# Altium schematic symbol library LATTICEPLDS_Library.SchLib: 291 symbols (part 13 of 32)
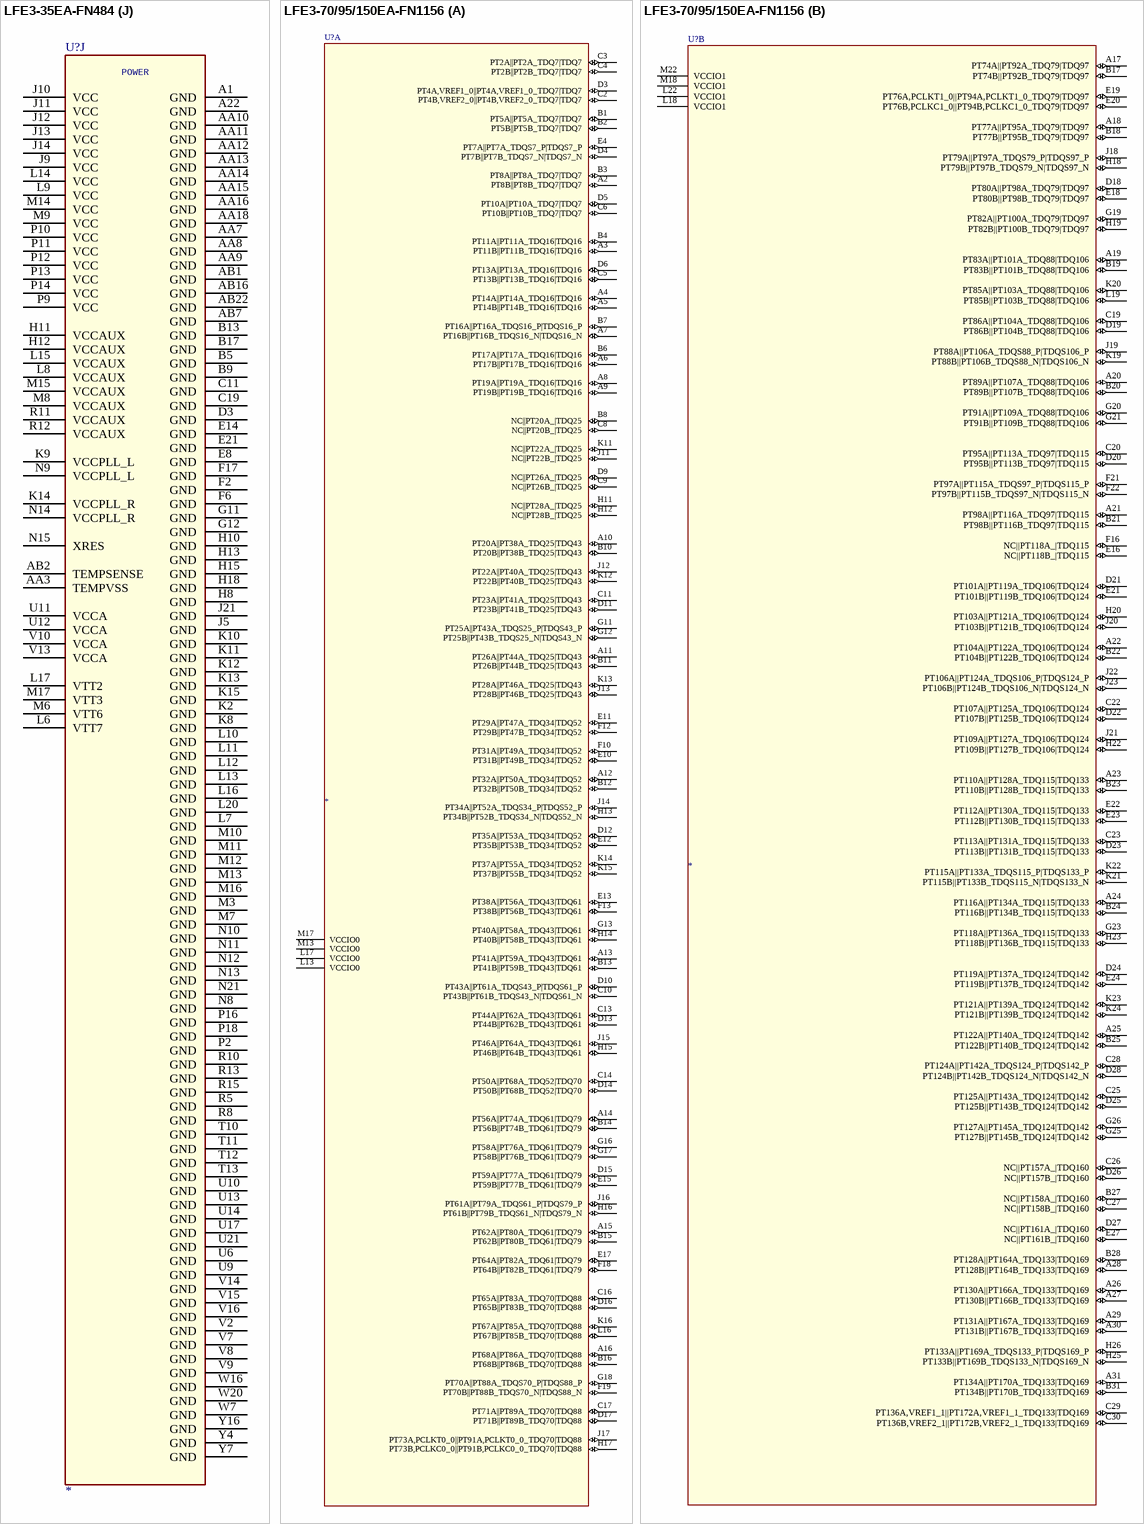
[diagram p315: symbols LFE3-35EA-FN484 to LFE3-70/95/150EA-FN1156]

## LFE3-35EA-FN484
designator U?
SPLIT_INST: TRUE; SWAP_INFO: (S1+S2+S3+S4+S5+S6+S7+S8+S9+S10)
part A pins: A2 PT8B (TDQ7), A3 PT11A (TDQ16), A4 PT11B (TDQ16), A5 PT14A (TDQ16), A6 PT14B (TDQ16), A7 PT26B (TDQ25), A8 PT29B (TDQ34), A9 PT32A (TDQ34), A10 PT35A (TDQ34), A11 PT35B (TDQ34), B3 PT8A (TDQ7), B4 PT2B (TDQ7), B6 PT5B (TDQ7), B7 PT26A (TDQ25), B8 PT29A (TDQ34), B10 PT32B (TDQ34), C5 PT2A (TDQ7), C6 PT5A (TDQ7), C7 PT20B (TDQ25), C8 PT20A (TDQ25), C9 PT23A (TDQ25), C10 PT23B (TDQ25), D5 PT4B ||  VREF2_0 (TDQ7), D6 PT10A (TDQ7), D7 PT10B (TDQ7), D8 PT28A (TDQ25), D9 PT25A (TDQS25), D10 PT25B (TDQ25), D11 PT34B (TDQ34), E6 PT4A ||  VREF1_0 (TDQ7), E7 PT28B (TDQ25), E9 PT22B (TDQ25), E10 PT31B (TDQ34), E11 PT34A (TDQS34), F7 PT13A (TDQ16), F8 PT7A (TDQS7), F9 PT22A (TDQ25), F10 PT31A (TDQ34), F11 PT37A ||  PCLKT0_0 (TDQ34), F12 PT37B ||  PCLKC0_0 (TDQ34), G8 PT13B (TDQ16), G9 PT7B (TDQ7), G10 VCCIO0 (power), H9 VCCIO0 (power)
part B pins: A12 PT41A (TDQ43), A13 PT41B (TDQ43), A14 PT47A (TDQ52), A15 PT50A (TDQ52), A16 PT56A (TDQ61), A17 PT59A (TDQ61), A18 PT62A (TDQ61), A19 PT62B (TDQ61), B11 PT38A (TDQ43), B12 PT38B (TDQ43), B14 PT47B (TDQ52), B15 PT50B (TDQ52), B16 PT56B (TDQ61), B18 PT59B (TDQ61), C12 PT40A ||  PCLKT1_0 (TDQ43), C13 PT44A (TDQ43), C14 PT44B (TDQ43), C15 PT53A (TDQ52), C16 PT61B (TDQ61), C17 PT61A (TDQS61), D12 PT40B ||  PCLKC1_0 (TDQ43), D13 PT46A (TDQ43), D14 PT46B (TDQ43), D15 PT53B (TDQ52), D16 PT64A ||  VREF1_1 (TDQ61), D17 PT64B ||  VREF2_1 (TDQ61), E12 PT43A (TDQS43), E13 PT43B (TDQ43), E15 PT52B (TDQ52), E16 PT52A (TDQS52), F13 PT49A (TDQ52), F14 PT49B (TDQ52), F15 PT58A (TDQ61), F16 PT58B (TDQ61), G13 VCCIO1 (power), G14 PT55B (TDQ52), G15 PT55A (TDQ52), H14 VCCIO1 (power)
part C pins: E22 PR18A (RDQ23), F22 PR18B (RDQ23), G21 PR21A* (RDQ23), G22 PR21B* (RDQ23), H21 PR24A (RDQ23), H22 PR24B (RDQ23), J15 VCCIO2 (power), J17 PR20A* (RDQ23), J18 PR20B* (RDQ23), J19 PR23A (RDQS23), J20 PR23B (RDQ23), J22 PR27A (RDQ32), K16 VCCIO2 (power), K17 PR26A* ||  VREF1_2 (RDQ23), K18 PR26B* ||  VREF2_2 (RDQ23), K19 PR29B* ||  RUM0_GDLLT_IN_B (RDQ32), K20 PR29A* ||  RUM0_GDLLT_IN_A (RDQ32), K21 PR30A* ||  RUM0_GDLLT_FB_A (RDQ32), K22 PR27B (RDQ32), L18 PR32A (RDQS32), L19 PR32B (RDQ32), L21 PR30B* ||  RUM0_GDLLT_FB_B (RDQ32), L22 PR33A (RDQ32), M18 PR35E_C ||  RUM0_GPLLT_IN_A (RDQ32), M20 PR35B* ||  PCLKC2_0 (RDQ32), M21 PR35A* ||  PCLKT2_0 (RDQ32), M22 PR33B (RDQ32), N17 PR35E_D ||  RUM0_GPLLT_IN_B (RDQ32), N22 PR35E_B ||  RUM0_GPLLT_FB_B (RDQ32), P21 PR35E_A ||  RUM0_GPLLT_FB_A (RDQ32)
part D pins: AA17 PB62B, AA19 PB71A, AA20 PR71A* (RDQ68), AA21 PR68A (RDQS68), AA22 PR63A (RDQ68), AB17 PB62A, AB18 PB65A, AB19 PB65B, AB20 PR71B* (RDQ68), AB21 PR63B (RDQ68), M19 PR38B* ||  PCLKC3_0 (RDQ41), N16 VCCIO3 (power), N18 PR41A (RDQS41), N19 PR38A* ||  PCLKT3_0 (RDQ41), N20 PR44B* ||  VREF2_3 (RDQ41), P15 VCCIO3 (power), P17 PR47B* (RDQ50), P19 PR41B (RDQ41), P20 PR44A* ||  VREF1_3 (RDQ41), P22 PR36A (RDQ41), R14 PB64B, R16 PR47A* (RDQ50), R17 PR53E_C ||  RLM1_GPLLT_IN_A (RDQ50), R18 PR53B* (RDQ50), R19 PR53A* (RDQ50), R20 PR42B (RDQ41), R21 PR36B (RDQ41), R22 PR39A* (RDQ41), T14 PB64A, T15 PB73A, T16 PB73B, T17 PR53E_D ||  RLM1_GPLLT_IN_B (RDQ50), T18 PR65B* (RDQ68), T19 PR65A* (RDQ68), T20 PR42A (RDQ41), T21 PR50A (RDQS50), T22 PR39B* (RDQ41), U15 PB61B, U16 PB61A, U18 PR66B* (RDQ68), U19 PR66A* (RDQ68), U20 PR50B (RDQ50), U22 PR45A (RDQ50), V17 PB70B, V18 PB70A, V19 PR69B (RDQ68), V20 PR53E_B ||  RLM1_GPLLT_FB_B (RDQ50), V21 PR53E_A ||  RLM1_GPLLT_FB_A (RDQ50), V22 PR45B (RDQ50), W17 PB67B, W18 PB67A, W19 PR69A (RDQ68), W21 PR51B (RDQ50), W22 PR48B* (RDQ50), Y17 PB68A, Y18 PB68B, Y19 PB71B, Y20 PR68B (RDQ68), Y21 PR51A (RDQ50), Y22 PR48A* (RDQ50)
part E pins: AA1 PL66A* (LDQ68), AA2 PL69B (LDQ68), AA4 PB5A, AA5 PB5B, AA6 PB11B, AB3 PB2A, AB4 PB2B, AB5 PB8A, AB6 PB8B, L2 PL36B (LDQ41), L3 PL36A (LDQ41), L4 PL38A* ||  PCLKT6_0 (LDQ41), M1 PL39B* (LDQ41), M2 PL39A* (LDQ41), M4 PL38B* ||  PCLKC6_0 (LDQ41), M5 PL41A (LDQS41), N1 PL42B (LDQ41), N2 PL42A (LDQ41), N3 PL45A (LDQ50), N4 PL44A* ||  VREF1_6 (LDQ41), N5 PL47A* (LDQ50), N6 PL41B (LDQ41), N7 VCCIO6 (power), P1 PL48A* (LDQ50), P3 PL45B (LDQ50), P4 PL44B* ||  VREF2_6 (LDQ41), P5 PL50A (LDQS50), P6 PL47B* (LDQ50), P7 PL56B* (LDQ59), P8 VCCIO6 (power), R1 PL48B* (LDQ50), R2 PL51B (LDQ50), R3 PL51A (LDQ50), R4 PL62A* (LDQ59), R6 PL50B (LDQ50), R7 PL59A (LDQS59), R9 PB16A, T1 PL53E_B ||  LLM1_GPLLT_FB_B (LDQ50), T2 PL53E_A ||  LLM1_GPLLT_FB_A (LDQ50), T3 PL53E_C ||  LLM1_GPLLT_IN_A (LDQ50), T4 PL65A* (LDQ68), T5 PL62B* (LDQ59), T6 PL68A (LDQS68), T7 PL59B (LDQ59), T8 PB13B, T9 PB16B, U1 PL53A* (LDQ50), U2 PL53B* (LDQ50), U3 PL53E_D ||  LLM1_GPLLT_IN_B (LDQ50), U4 PL65B* (LDQ68), U5 PL68B (LDQ68), U7 PB10B, U8 PB13A, V1 PL57A* (LDQ59), V3 PL60A (LDQ59), V4 PL71A* (LDQ68), V5 PL71B* (LDQ68), V6 PB10A, W1 PL57B* (LDQ59), W2 PL63A (LDQ68), W3 PL60B (LDQ59), W4 PB4A, W5 PB7A, W6 PB7B, Y1 PL63B (LDQ68), Y2 PL66B* (LDQ68), Y3 PL69A (LDQ68), Y5 PB4B, Y6 PB11A
part F pins: B1 PL21A* (LDQ23), B2 PL12A* (LDQ14), C1 PL21B* (LDQ23), C2 PL12B* (LDQ14), D1 PL15B (LDQ14), D2 PL15A (LDQ14), D4 PL9B (LDQ14), E1 PL26A* ||  VREF1_7 (LDQ23), E2 PL18A (LDQ23), E3 PL9A (LDQ14), E4 PL11B* (LDQ14), E5 PL11A* (LDQ14), F1 PL26B* ||  VREF2_7 (LDQ23), F3 PL18B (LDQ23), F4 PL14B (LDQ14), F5 PL14A (LDQS14), G1 PL27A (LDQ32), G2 PL24B (LDQ23), G3 PL24A (LDQ23), G4 PL17A* (LDQ14), G5 PL17B* (LDQ14), H1 PL27B (LDQ32), H2 PL30A* ||  LUM0_GDLLT_FB_A (LDQ32), H3 PL30B* ||  LUM0_GDLLT_FB_B (LDQ32), H4 PL20A* (LDQ23), H5 PL23A (LDQS23), H6 PL23B (LDQ23), J1 PL33B (LDQ32), J2 PL33A (LDQ32), J3 PL32A (LDQS32), J4 PL20B* (LDQ23), J6 PL29B* ||  LUM0_GDLLT_IN_B (LDQ32), J7 PL29A* ||  LUM0_GDLLT_IN_A (LDQ32), J8 VCCIO7 (power), K1 PL35E_A ||  LUM0_GPLLT_FB_A (LDQ32), K3 PL32B (LDQ32), K4 PL35A* ||  PCLKT7_0 (LDQ32), K5 PL35B* ||  PCLKC7_0 (LDQ32), K6 PL35E_D ||  LUM0_GPLLT_IN_B (LDQ32), K7 VCCIO7 (power), L1 PL35E_B ||  LUM0_GPLLT_FB_B (LDQ32), L5 PL35E_C ||  LUM0_GPLLT_IN_A (LDQ32)
part G pins: A20 PT71A , A21 PR9A ||  DOUT/CSON/CSSPI1N, B19 PT68B , B20 PT71B , B21 CFG2, B22 PR9B ||  MCLK, C18 PT68A, C20 PROGRAMN, C21 PR6A ||  HFP, C22 PR12A ||  D1, D18 PT73A , D19 PT73B , D20 INITN, D21 PR6B ||  DI/CSSPI0N/CEN/CSSPIN, D22 PR12B ||  D2, E17 PT70B , E18 PT70A, E19 CFG1, E20 CFG0, F18 PR8B ||  CSN/SN/CONT1N/OEN, F19 PR8A ||  CS1N/HOLDN/CONT2N/RDY, F20 CCLK, F21 DONE, G16 VCCIO8 (power), G17 PR14A ||  D3/SI, G18 PR14B ||  D4/SO, G19 PR15A ||  D5, G20 PR15B ||  D6/SPID1, H16 VCCIO8 (power), H17 PR11B ||  D0/SPIFASTN, H19 PR17A ||  D7/SPID0, H20 PR17B ||  BUSY/SISPI/AVDN, J16 PR11A ||  WRITEN
part H pins: C3 TDO (out), C4 TMS (in), G6 TDI (in), G7 TCK (in), H7 VCCJ (power)
part I pins: AB8 PCSA_HDOUTP3, AB9 PCSA_HDOUTN3, AB10 PCSA_HDOUTN2, AB11 PCSA_HDOUTP2, AB12 PCSA_HDOUTP1, AB13 PCSA_HDOUTN1, AB14 PCSA_HDOUTN0, AB15 PCSA_HDOUTP0, V11 PCSA_REFCLKN, V12 PCSA_REFCLKP, W8 PCSA_VCCIB3, W9 PCSA_VCCOB3, W10 PCSA_VCCOB2, W11 PCSA_VCCIB2, W12 PCSA_VCCIB1, W13 PCSA_VCCOB1, W14 PCSA_VCCOB0, W15 PCSA_VCCIB0, Y8 PCSA_HDINP3, Y9 PCSA_HDINN3, Y10 PCSA_HDINN2, Y11 PCSA_HDINP2, Y12 PCSA_HDINP1, Y13 PCSA_HDINN1, Y14 PCSA_HDINN0, Y15 PCSA_HDINP0
part J pins: A1 GND (power), A22 GND (power), AA3 TEMPVSS, AA7 GND (power), AA8 GND (power), AA9 GND (power), AA10 GND (power), AA11 GND (power), AA12 GND (power), AA13 GND (power), AA14 GND (power), AA15 GND (power), AA16 GND (power), AA18 GND (power), AB1 GND (power), AB2 TEMPSENSE, AB7 GND (power), AB16 GND (power), AB22 GND (power), B5 GND (power), B9 GND (power), B13 GND (power), B17 GND (power), C11 GND (power), C19 GND (power), D3 GND (power), E8 GND (power), E14 GND (power), E21 GND (power), F2 GND (power), F6 GND (power), F17 GND (power), G11 GND (power), G12 GND (power), H8 GND (power), H10 GND (power), H11 VCCAUX (power), H12 VCCAUX (power), H13 GND (power), H15 GND (power), H18 GND (power), J5 GND (power), J9 VCC (power), J10 VCC (power), J11 VCC (power), J12 VCC (power), J13 VCC (power), J14 VCC (power), J21 GND (power), K2 GND (power), K8 GND (power), K9 VCCPLL_L (power), K10 GND (power), K11 GND (power), K12 GND (power), K13 GND (power), K14 VCCPLL_R (power), K15 GND (power), L6 VTT7 (power), L7 GND (power), L8 VCCAUX (power), L9 VCC (power), L10 GND (power), L11 GND (power), L12 GND (power), L13 GND (power), L14 VCC (power), L15 VCCAUX (power), L16 GND (power), L17 VTT2 (power), L20 GND (power), M3 GND (power), M6 VTT6 (power), M7 GND (power), M8 VCCAUX (power), M9 VCC (power), M10 GND (power), M11 GND (power), M12 GND (power), M13 GND (power), M14 VCC (power), M15 VCCAUX (power), M16 GND (power), M17 VTT3 (power), N8 GND (power), N9 VCCPLL_L (power), N10 GND (power), N11 GND (power), N12 GND (power), N13 GND (power), N14 VCCPLL_R (power), N15 XRES, N21 GND (power), P2 GND (power), P9 VCC (power), P10 VCC (power), P11 VCC (power), P12 VCC (power), P13 VCC (power), P14 VCC (power), P16 GND (power), P18 GND (power), R5 GND (power), R8 GND (power), R10 GND (power), R11 VCCAUX (power), R12 VCCAUX (power), R13 GND (power), R15 GND (power), T10 GND (power), T11 GND (power), T12 GND (power), T13 GND (power), U6 GND (power), U9 GND (power), U10 GND (power), U11 VCCA (power), U12 VCCA (power), U13 GND (power), U14 GND (power), U17 GND (power), U21 GND (power), V2 GND (power), V7 GND (power), V8 GND (power), V9 GND (power), V10 VCCA (power), V13 VCCA (power), V14 GND (power), V15 GND (power), V16 GND (power), W7 GND (power), W16 GND (power), W20 GND (power), Y4 GND (power), Y7 GND (power), Y16 GND (power)
part A text: BANK0; 1st_Fn. || 2nd_Fn. (DQ)
part B text: BANK1; 1st_Fn. || 2nd_Fn. (DQ)
part C text: BANK2; * = TRUE LVDS Output; 1st_Fn. || 2nd_Fn. (DQ)
part D text: BANK3; * = TRUE LVDS Output; 1st_Fn. || 2nd_Fn. (DQ)
part E text: BANK6; * = TRUE LVDS Output; 1st_Fn. || 2nd_Fn. (DQ)
part F text: BANK7; * = TRUE LVDS Output; 1st_Fn. || 2nd_Fn. (DQ)
part G text: BANK8; 1st_Fn. || 2nd_Fn.
part H text: JTAG
part I text: SERDES/PCS
part J text: POWER

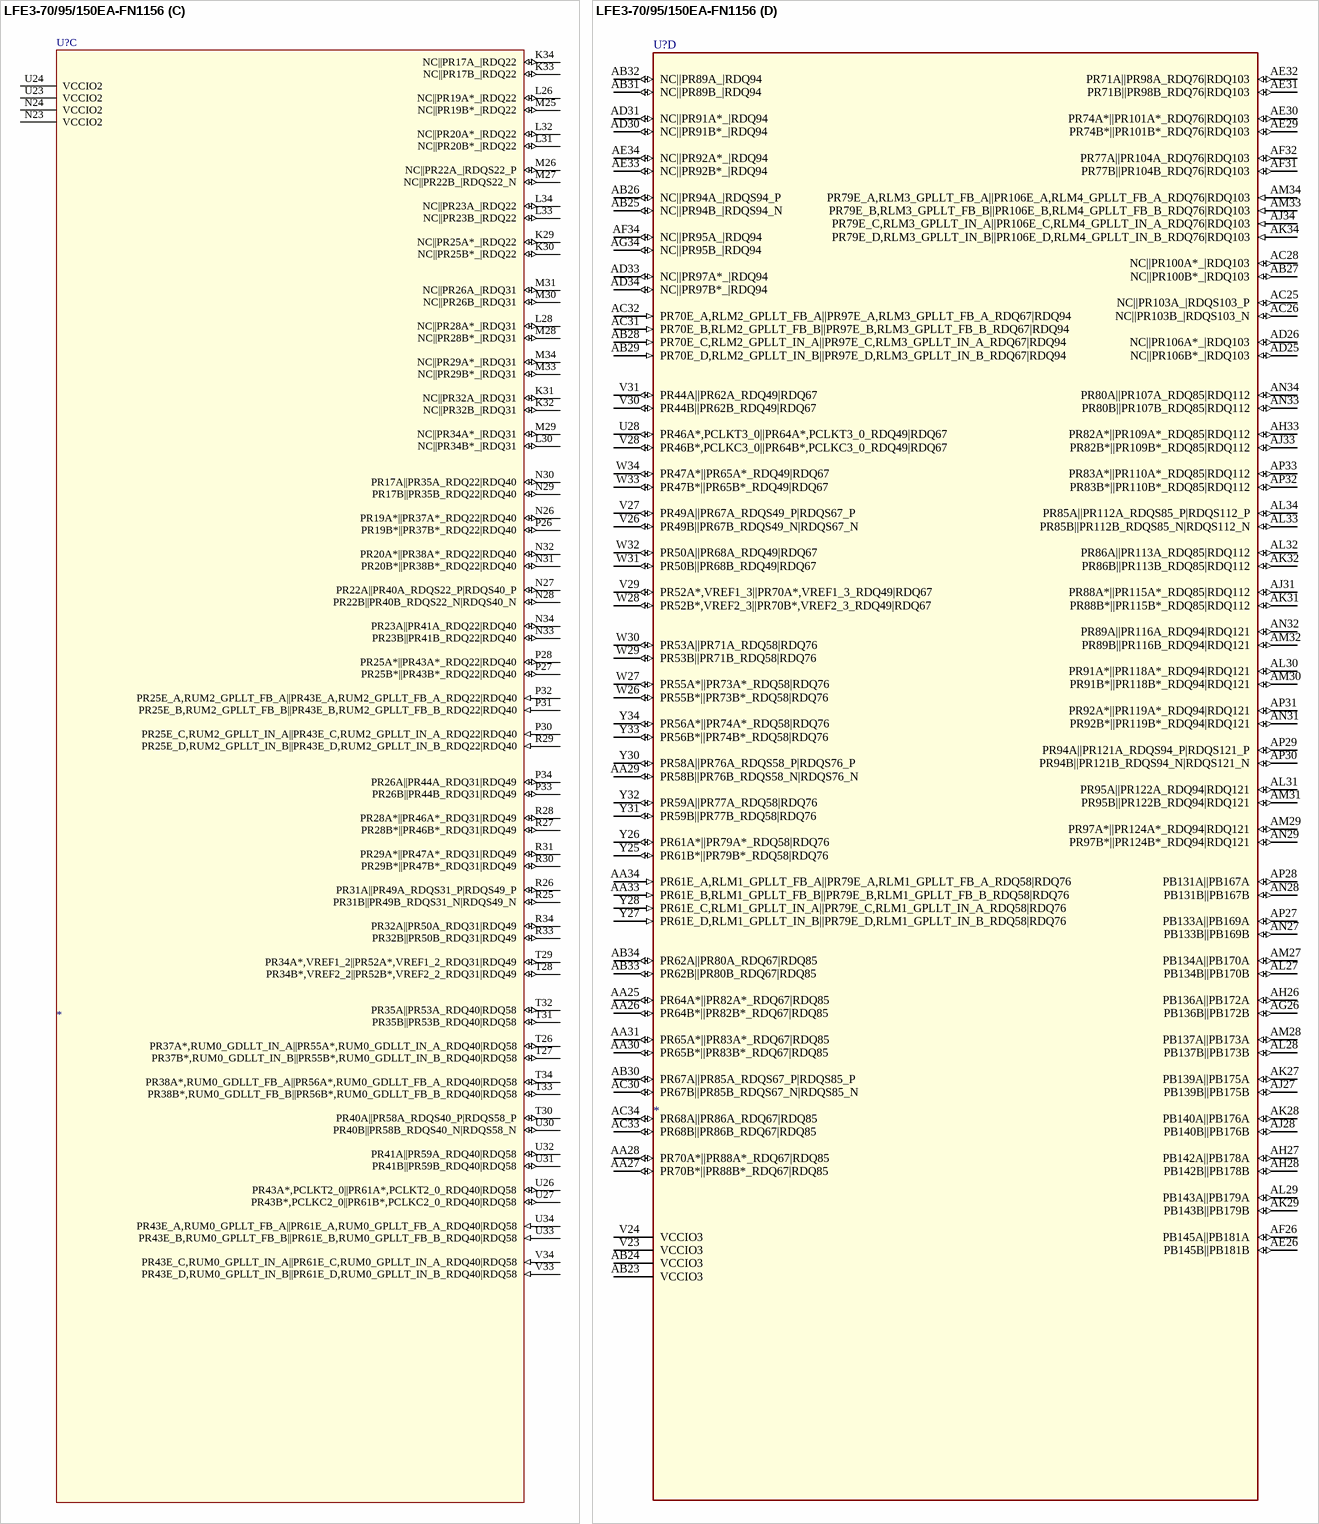
[diagram p133: symbol LFE3-70/95/150EA-FN1156]

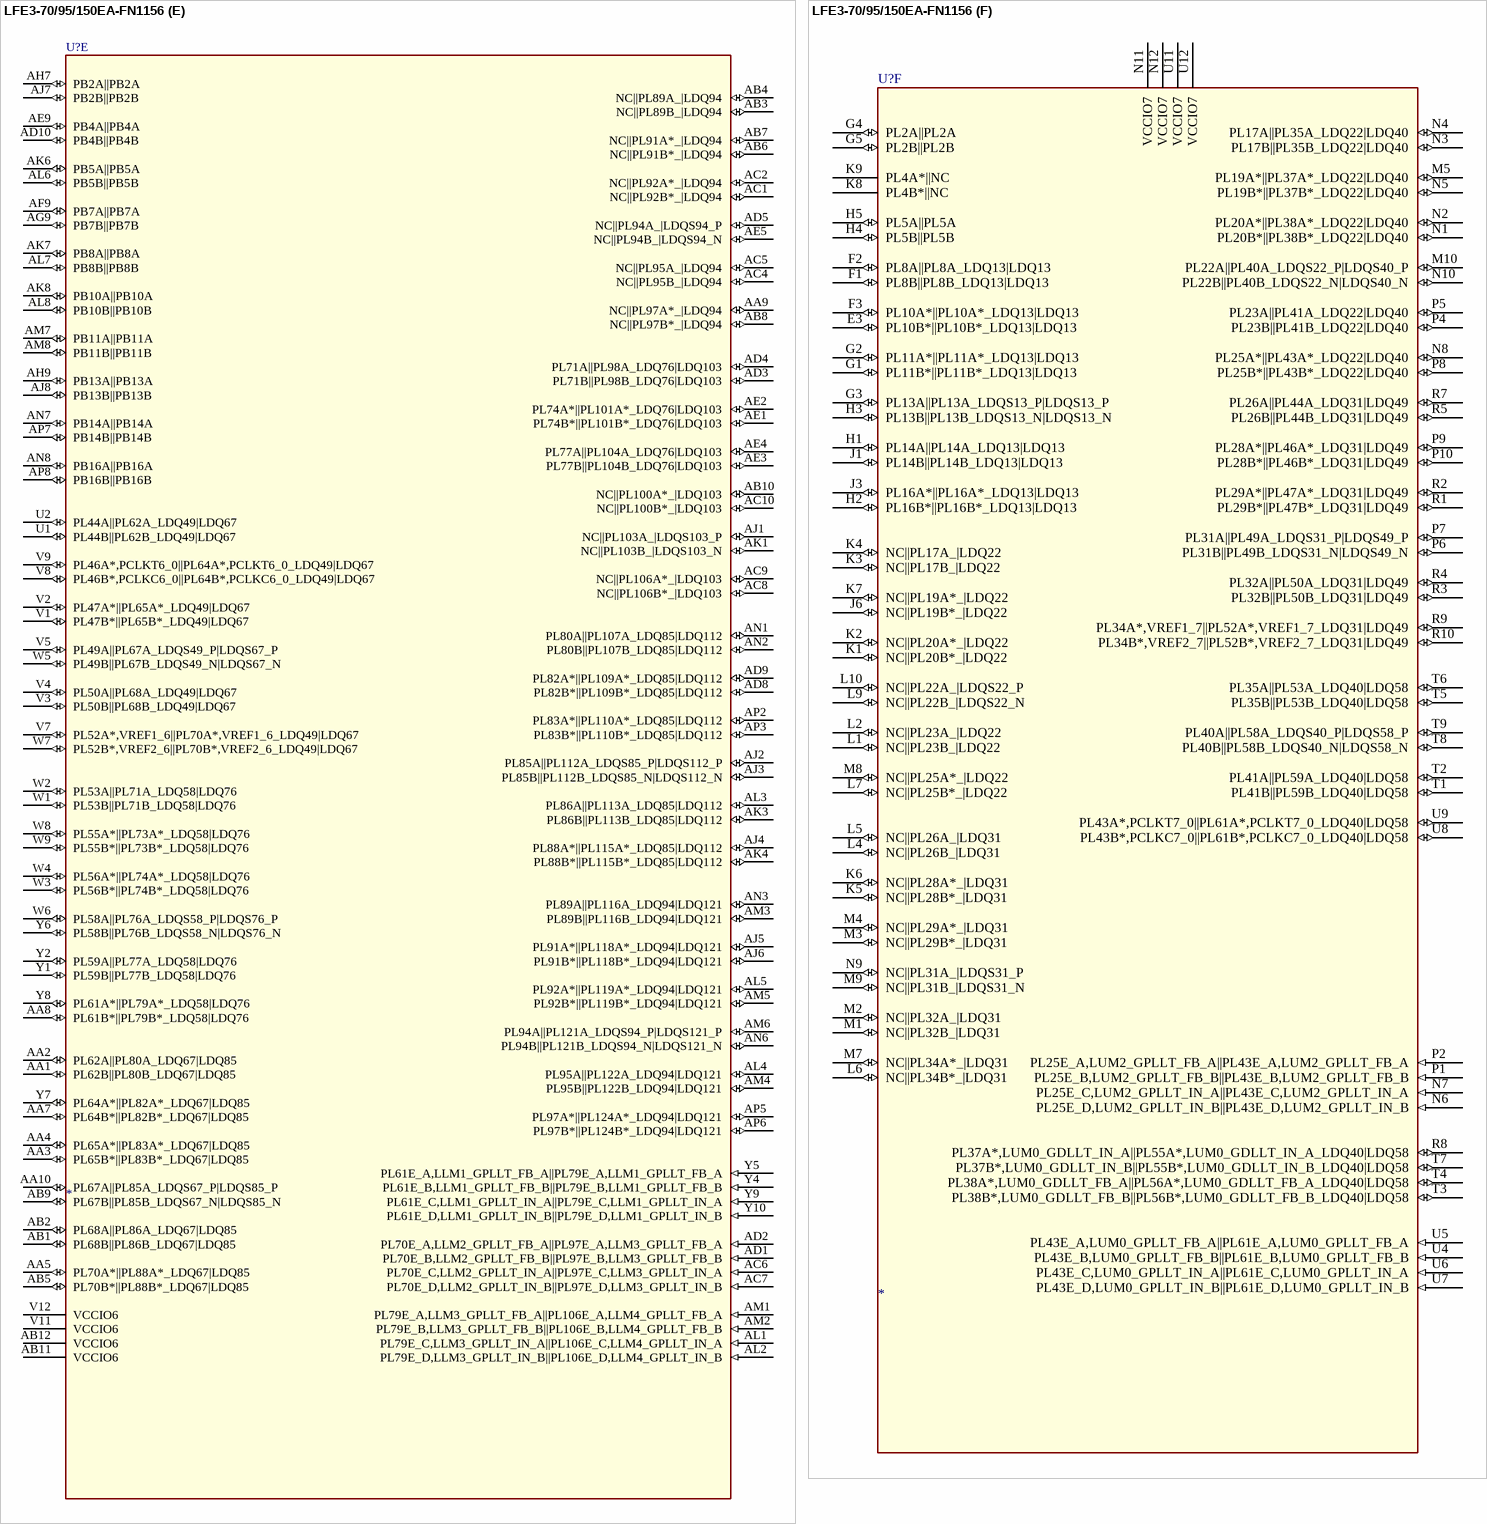
[diagram p134: symbol LFE3-70/95/150EA-FN1156]

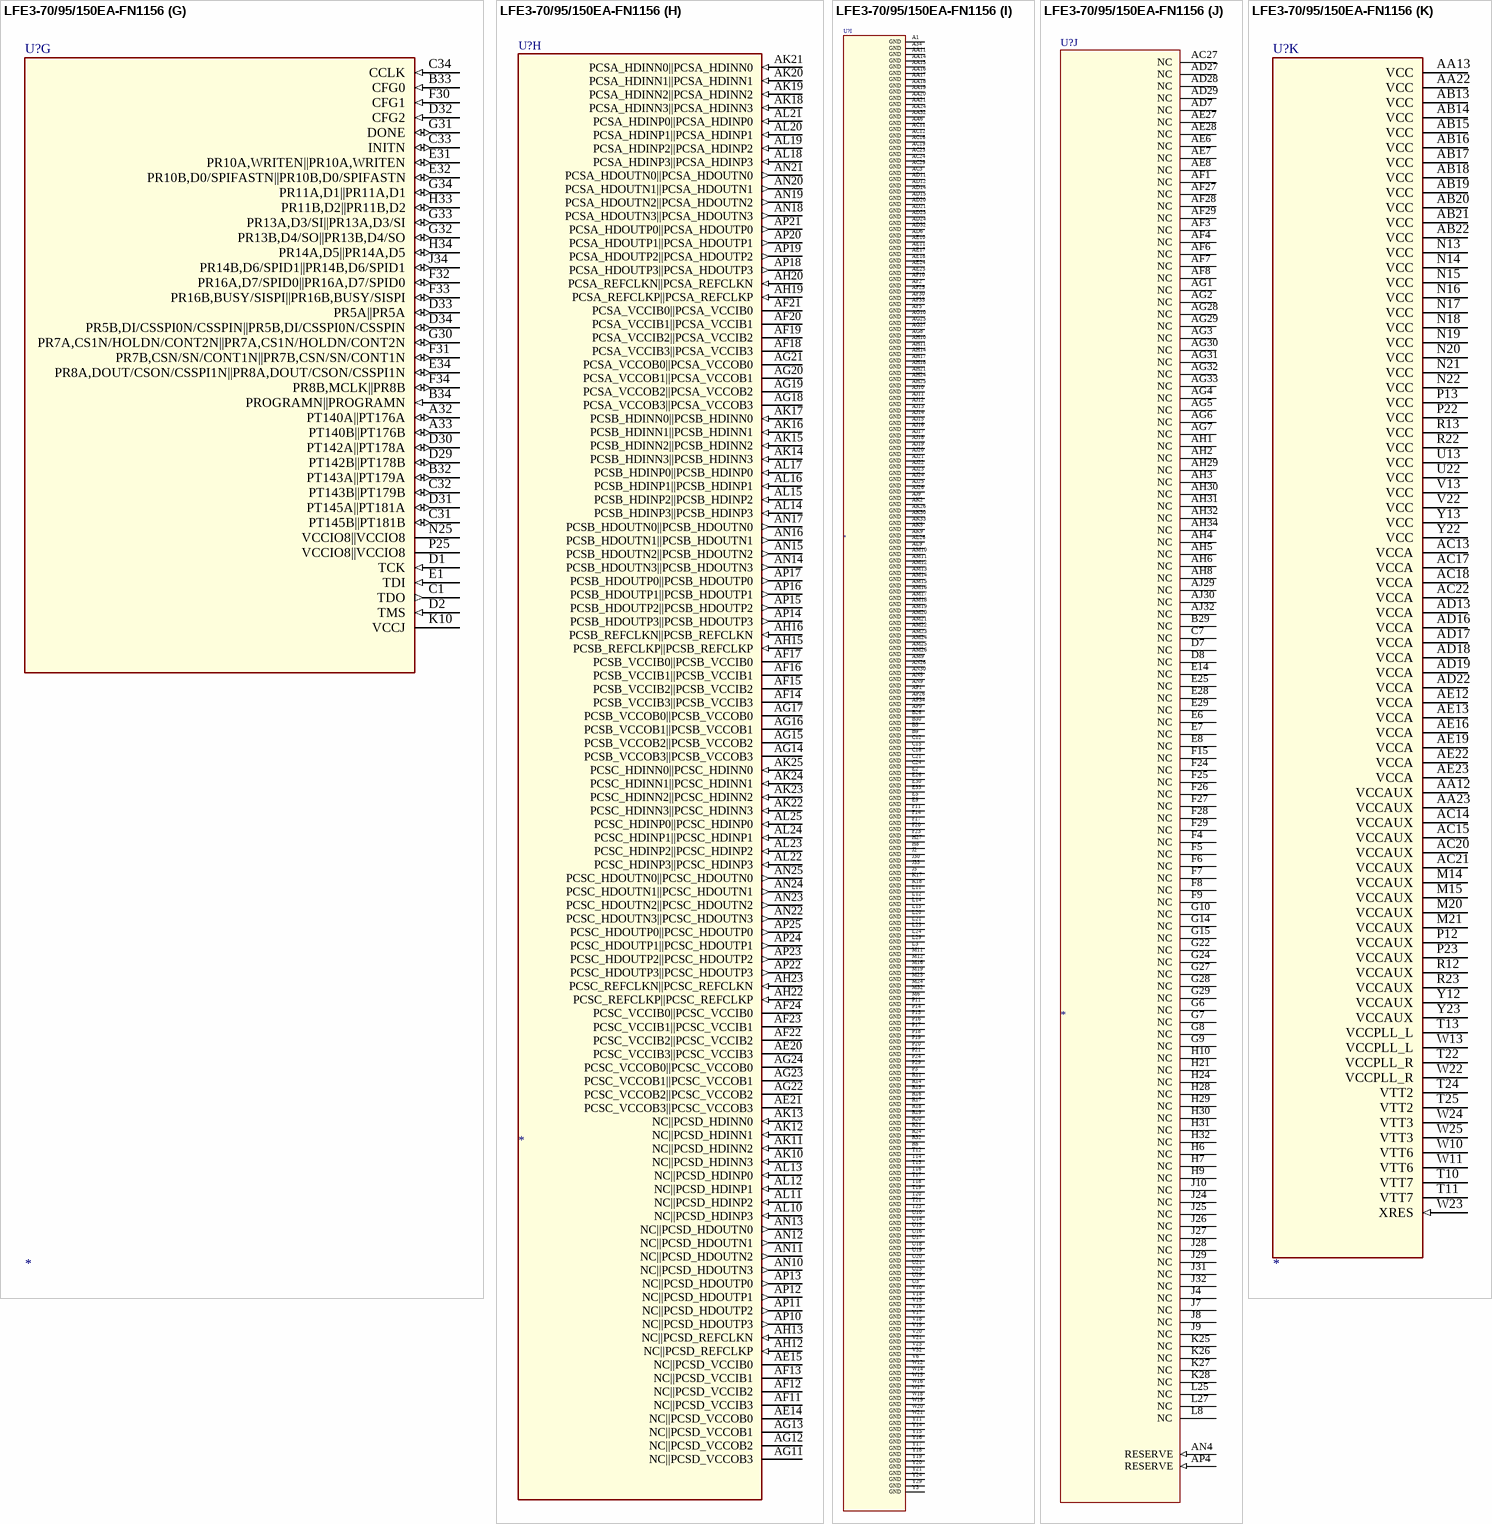
[diagram p135: symbol LFE3-70/95/150EA-FN1156]

## LFE3-70/95/150EA-FN1156
designator U?
SPLIT_INST: TRUE; SWAP_INFO: (S1+S2+S3+S4+S5+S6+S7+S8+S9+S10+S11)
part A pins: A2 PT8B||PT8B_TDQ7|TDQ7 (io), A3 PT11B||PT11B_TDQ16|TDQ16 (io), A4 PT14A||PT14A_TDQ16|TDQ16 (io), A5 PT14B||PT14B_TDQ16|TDQ16 (io), A6 PT17B||PT17B_TDQ16|TDQ16 (io), A7 PT16B||PT16B_TDQS16_N|TDQS16_N (io), A8 PT19A||PT19A_TDQ16|TDQ16 (io), A9 PT19B||PT19B_TDQ16|TDQ16 (io), A10 PT20A||PT38A_TDQ25|TDQ43 (io), A11 PT26A||PT44A_TDQ25|TDQ43 (io), A12 PT32A||PT50A_TDQ34|TDQ52 (io), A13 PT41A||PT59A_TDQ43|TDQ61 (io), A14 PT56A||PT74A_TDQ61|TDQ79 (io), A15 PT62A||PT80A_TDQ61|TDQ79 (io), A16 PT68A||PT86A_TDQ70|TDQ88 (io), B1 PT5A||PT5A_TDQ7|TDQ7 (io), B2 PT5B||PT5B_TDQ7|TDQ7 (io), B3 PT8A||PT8A_TDQ7|TDQ7 (io), B4 PT11A||PT11A_TDQ16|TDQ16 (io), B6 PT17A||PT17A_TDQ16|TDQ16 (io), B7 PT16A||PT16A_TDQS16_P|TDQS16_P (io), B8 NC||PT20A_|TDQ25 (io), B10 PT20B||PT38B_TDQ25|TDQ43 (io), B11 PT26B||PT44B_TDQ25|TDQ43 (io), B12 PT32B||PT50B_TDQ34|TDQ52 (io), B13 PT41B||PT59B_TDQ43|TDQ61 (io), B14 PT56B||PT74B_TDQ61|TDQ79 (io), B15 PT62B||PT80B_TDQ61|TDQ79 (io), B16 PT68B||PT86B_TDQ70|TDQ88 (io), C2 PT4B,VREF2_0||PT4B,VREF2_0_TDQ7|TDQ7 (io), C3 PT2A||PT2A_TDQ7|TDQ7 (io), C4 PT2B||PT2B_TDQ7|TDQ7 (io), C5 PT13B||PT13B_TDQ16|TDQ16 (io), C6 PT10B||PT10B_TDQ7|TDQ7 (io), C8 NC||PT20B_|TDQ25 (io), C9 NC||PT26B_|TDQ25 (io), C10 PT43B||PT61B_TDQS43_N|TDQS61_N (io), C11 PT23A||PT41A_TDQ25|TDQ43 (io), C13 PT44A||PT62A_TDQ43|TDQ61 (io), C14 PT50A||PT68A_TDQ52|TDQ70 (io), C16 PT65A||PT83A_TDQ70|TDQ88 (io), C17 PT71A||PT89A_TDQ70|TDQ88 (io), D3 PT4A,VREF1_0||PT4A,VREF1_0_TDQ7|TDQ7 (io), D4 PT7B||PT7B_TDQS7_N|TDQS7_N (io), D5 PT10A||PT10A_TDQ7|TDQ7 (io), D6 PT13A||PT13A_TDQ16|TDQ16 (io), D9 NC||PT26A_|TDQ25 (io), D10 PT43A||PT61A_TDQS43_P|TDQS61_P (io), D11 PT23B||PT41B_TDQ25|TDQ43 (io), D12 PT35A||PT53A_TDQ34|TDQ52 (io), D13 PT44B||PT62B_TDQ43|TDQ61 (io), D14 PT50B||PT68B_TDQ52|TDQ70 (io), D15 PT59A||PT77A_TDQ61|TDQ79 (io), D16 PT65B||PT83B_TDQ70|TDQ88 (io), D17 PT71B||PT89B_TDQ70|TDQ88 (io), E4 PT7A||PT7A_TDQS7_P|TDQS7_P (io), E10 PT31B||PT49B_TDQ34|TDQ52 (io), E11 PT29A||PT47A_TDQ34|TDQ52 (io), E12 PT35B||PT53B_TDQ34|TDQ52 (io), E13 PT38A||PT56A_TDQ43|TDQ61 (io), E15 PT59B||PT77B_TDQ61|TDQ79 (io), E17 PT64A||PT82A_TDQ61|TDQ79 (io), F10 PT31A||PT49A_TDQ34|TDQ52 (io), F12 PT29B||PT47B_TDQ34|TDQ52 (io), F13 PT38B||PT56B_TDQ43|TDQ61 (io), F18 PT64B||PT82B_TDQ61|TDQ79 (io), F19 PT70B||PT88B_TDQS70_N|TDQS88_N (io), G11 PT25A||PT43A_TDQS25_P|TDQS43_P (io), G12 PT25B||PT43B_TDQS25_N|TDQS43_N (io), G13 PT40A||PT58A_TDQ43|TDQ61 (io), G16 PT58A||PT76A_TDQ61|TDQ79 (io), G17 PT58B||PT76B_TDQ61|TDQ79 (io), G18 PT70A||PT88A_TDQS70_P|TDQS88_P (io), H11 NC||PT28A_|TDQ25 (io), H12 NC||PT28B_|TDQ25 (io), H13 PT34B||PT52B_TDQS34_N|TDQS52_N (io), H14 PT40B||PT58B_TDQ43|TDQ61 (io), H15 PT46B||PT64B_TDQ43|TDQ61 (io), H16 PT61B||PT79B_TDQS61_N|TDQS79_N (io), H17 PT73B,PCLKC0_0||PT91B,PCLKC0_0_TDQ70|TDQ88 (io), J11 NC||PT22B_|TDQ25 (io), J12 PT22A||PT40A_TDQ25|TDQ43 (io), J13 PT28B||PT46B_TDQ25|TDQ43 (io), J14 PT34A||PT52A_TDQS34_P|TDQS52_P (io), J15 PT46A||PT64A_TDQ43|TDQ61 (io), J16 PT61A||PT79A_TDQS61_P|TDQS79_P (io), J17 PT73A,PCLKT0_0||PT91A,PCLKT0_0_TDQ70|TDQ88 (io), K11 NC||PT22A_|TDQ25 (io), K12 PT22B||PT40B_TDQ25|TDQ43 (io), K13 PT28A||PT46A_TDQ25|TDQ43 (io), K14 PT37A||PT55A_TDQ34|TDQ52 (io), K15 PT37B||PT55B_TDQ34|TDQ52 (io), K16 PT67A||PT85A_TDQ70|TDQ88 (io), L13 VCCIO0 (power), L16 PT67B||PT85B_TDQ70|TDQ88 (io), L17 VCCIO0 (power), M13 VCCIO0 (power), M17 VCCIO0 (power)
part B pins: A17 PT74A||PT92A_TDQ79|TDQ97 (io), A18 PT77A||PT95A_TDQ79|TDQ97 (io), A19 PT83A||PT101A_TDQ88|TDQ106 (io), A20 PT89A||PT107A_TDQ88|TDQ106 (io), A21 PT98A||PT116A_TDQ97|TDQ115 (io), A22 PT104A||PT122A_TDQ106|TDQ124 (io), A23 PT110A||PT128A_TDQ115|TDQ133 (io), A24 PT116A||PT134A_TDQ115|TDQ133 (io), A25 PT122A||PT140A_TDQ124|TDQ142 (io), A26 PT130A||PT166A_TDQ133|TDQ169 (io), A27 PT130B||PT166B_TDQ133|TDQ169 (io), A28 PT128B||PT164B_TDQ133|TDQ169 (io), A29 PT131A||PT167A_TDQ133|TDQ169 (io), A30 PT131B||PT167B_TDQ133|TDQ169 (io), A31 PT134A||PT170A_TDQ133|TDQ169 (io), B17 PT74B||PT92B_TDQ79|TDQ97 (io), B18 PT77B||PT95B_TDQ79|TDQ97 (io), B19 PT83B||PT101B_TDQ88|TDQ106 (io), B20 PT89B||PT107B_TDQ88|TDQ106 (io), B21 PT98B||PT116B_TDQ97|TDQ115 (io), B22 PT104B||PT122B_TDQ106|TDQ124 (io), B23 PT110B||PT128B_TDQ115|TDQ133 (io), B24 PT116B||PT134B_TDQ115|TDQ133 (io), B25 PT122B||PT140B_TDQ124|TDQ142 (io), B27 NC||PT158A_|TDQ160 (io), B28 PT128A||PT164A_TDQ133|TDQ169 (io), B31 PT134B||PT170B_TDQ133|TDQ169 (io), C19 PT86A||PT104A_TDQ88|TDQ106 (io), C20 PT95A||PT113A_TDQ97|TDQ115 (io), C22 PT107A||PT125A_TDQ106|TDQ124 (io), C23 PT113A||PT131A_TDQ115|TDQ133 (io), C25 PT125A||PT143A_TDQ124|TDQ142 (io), C26 NC||PT157A_|TDQ160 (io), C27 NC||PT158B_|TDQ160 (io), C28 PT124A||PT142A_TDQS124_P|TDQS142_P (io), C29 PT136A,VREF1_1||PT172A,VREF1_1_TDQ133|TDQ169 (io), C30 PT136B,VREF2_1||PT172B,VREF2_1_TDQ133|TDQ169 (io), D18 PT80A||PT98A_TDQ79|TDQ97 (io), D19 PT86B||PT104B_TDQ88|TDQ106 (io), D20 PT95B||PT113B_TDQ97|TDQ115 (io), D21 PT101A||PT119A_TDQ106|TDQ124 (io), D22 PT107B||PT125B_TDQ106|TDQ124 (io), D23 PT113B||PT131B_TDQ115|TDQ133 (io), D24 PT119A||PT137A_TDQ124|TDQ142 (io), D25 PT125B||PT143B_TDQ124|TDQ142 (io), D26 NC||PT157B_|TDQ160 (io), D27 NC||PT161A_|TDQ160 (io), D28 PT124B||PT142B_TDQS124_N|TDQS142_N (io), E16 NC||PT118B_|TDQ115 (io), E18 PT80B||PT98B_TDQ79|TDQ97 (io), E19 PT76A,PCLKT1_0||PT94A,PCLKT1_0_TDQ79|TDQ97 (io), E20 PT76B,PCLKC1_0||PT94B,PCLKC1_0_TDQ79|TDQ97 (io), E21 PT101B||PT119B_TDQ106|TDQ124 (io), E22 PT112A||PT130A_TDQ115|TDQ133 (io), E23 PT112B||PT130B_TDQ115|TDQ133 (io), E24 PT119B||PT137B_TDQ124|TDQ142 (io), E27 NC||PT161B_|TDQ160 (io), F16 NC||PT118A_|TDQ115 (io), F21 PT97A||PT115A_TDQS97_P|TDQS115_P (io), F22 PT97B||PT115B_TDQS97_N|TDQS115_N (io), G19 PT82A||PT100A_TDQ79|TDQ97 (io), G20 PT91A||PT109A_TDQ88|TDQ106 (io), G21 PT91B||PT109B_TDQ88|TDQ106 (io), G23 PT118A||PT136A_TDQ115|TDQ133 (io), G25 PT127B||PT145B_TDQ124|TDQ142 (io), G26 PT127A||PT145A_TDQ124|TDQ142 (io), H18 PT79B||PT97B_TDQS79_N|TDQS97_N (io), H19 PT82B||PT100B_TDQ79|TDQ97 (io), H20 PT103A||PT121A_TDQ106|TDQ124 (io), H22 PT109B||PT127B_TDQ106|TDQ124 (io), H23 PT118B||PT136B_TDQ115|TDQ133 (io), H25 PT133B||PT169B_TDQS133_N|TDQS169_N (io), H26 PT133A||PT169A_TDQS133_P|TDQS169_P (io), J18 PT79A||PT97A_TDQS79_P|TDQS97_P (io), J19 PT88A||PT106A_TDQS88_P|TDQS106_P (io), J20 PT103B||PT121B_TDQ106|TDQ124 (io), J21 PT109A||PT127A_TDQ106|TDQ124 (io), J22 PT106A||PT124A_TDQS106_P|TDQS124_P (io), J23 PT106B||PT124B_TDQS106_N|TDQS124_N (io), K19 PT88B||PT106B_TDQS88_N|TDQS106_N (io), K20 PT85A||PT103A_TDQ88|TDQ106 (io), K21 PT115B||PT133B_TDQS115_N|TDQS133_N (io), K22 PT115A||PT133A_TDQS115_P|TDQS133_P (io), K23 PT121A||PT139A_TDQ124|TDQ142 (io), K24 PT121B||PT139B_TDQ124|TDQ142 (io), L18 VCCIO1 (power), L19 PT85B||PT103B_TDQ88|TDQ106 (io), L22 VCCIO1 (power), M18 VCCIO1 (power), M22 VCCIO1 (power)
part C pins: K29 NC||PR25A*_|RDQ22 (io), K30 NC||PR25B*_|RDQ22 (io), K31 NC||PR32A_|RDQ31 (io), K32 NC||PR32B_|RDQ31 (io), K33 NC||PR17B_|RDQ22 (io), K34 NC||PR17A_|RDQ22 (io), L26 NC||PR19A*_|RDQ22 (io), L28 NC||PR28A*_|RDQ31 (io), L30 NC||PR34B*_|RDQ31 (io), L31 NC||PR20B*_|RDQ22 (io), L32 NC||PR20A*_|RDQ22 (io), L33 NC||PR23B_|RDQ22 (io), L34 NC||PR23A_|RDQ22 (io), M25 NC||PR19B*_|RDQ22 (io), M26 NC||PR22A_|RDQS22_P (io), M27 NC||PR22B_|RDQS22_N (io), M28 NC||PR28B*_|RDQ31 (io), M29 NC||PR34A*_|RDQ31 (io), M30 NC||PR26B_|RDQ31 (io), M31 NC||PR26A_|RDQ31 (io), M33 NC||PR29B*_|RDQ31 (io), M34 NC||PR29A*_|RDQ31 (io), N23 VCCIO2 (power), N24 VCCIO2 (power), N26 PR19A*||PR37A*_RDQ22|RDQ40 (io), N27 PR22A||PR40A_RDQS22_P|RDQS40_P (io), N28 PR22B||PR40B_RDQS22_N|RDQS40_N (io), N29 PR17B||PR35B_RDQ22|RDQ40 (io), N30 PR17A||PR35A_RDQ22|RDQ40 (io), N31 PR20B*||PR38B*_RDQ22|RDQ40 (io), N32 PR20A*||PR38A*_RDQ22|RDQ40 (io), N33 PR23B||PR41B_RDQ22|RDQ40 (io), N34 PR23A||PR41A_RDQ22|RDQ40 (io), P26 PR19B*||PR37B*_RDQ22|RDQ40 (io), P27 PR25B*||PR43B*_RDQ22|RDQ40 (io), P28 PR25A*||PR43A*_RDQ22|RDQ40 (io), P30 PR25E_C,RUM2_GPLLT_IN_A||PR43E_C,RUM2_GPLLT_IN_A_RDQ22|RDQ40 (in), P31 PR25E_B,RUM2_GPLLT_FB_B||PR43E_B,RUM2_GPLLT_FB_B_RDQ22|RDQ40 (in), P32 PR25E_A,RUM2_GPLLT_FB_A||PR43E_A,RUM2_GPLLT_FB_A_RDQ22|RDQ40 (in), P33 PR26B||PR44B_RDQ31|RDQ49 (io), P34 PR26A||PR44A_RDQ31|RDQ49 (io), R25 PR31B||PR49B_RDQS31_N|RDQS49_N (io), R26 PR31A||PR49A_RDQS31_P|RDQS49_P (io), R27 PR28B*||PR46B*_RDQ31|RDQ49 (io), R28 PR28A*||PR46A*_RDQ31|RDQ49 (io), R29 PR25E_D,RUM2_GPLLT_IN_B||PR43E_D,RUM2_GPLLT_IN_B_RDQ22|RDQ40 (in), R30 PR29B*||PR47B*_RDQ31|RDQ49 (io), R31 PR29A*||PR47A*_RDQ31|RDQ49 (io), R33 PR32B||PR50B_RDQ31|RDQ49 (io), R34 PR32A||PR50A_RDQ31|RDQ49 (io), T26 PR37A*,RUM0_GDLLT_IN_A||PR55A*,RUM0_GDLLT_IN_A_RDQ40|RDQ58 (io), T27 PR37B*,RUM0_GDLLT_IN_B||PR55B*,RUM0_GDLLT_IN_B_RDQ40|RDQ58 (io), T28 PR34B*,VREF2_2||PR52B*,VREF2_2_RDQ31|RDQ49 (io), T29 PR34A*,VREF1_2||PR52A*,VREF1_2_RDQ31|RDQ49 (io), T30 PR40A||PR58A_RDQS40_P|RDQS58_P (io), T31 PR35B||PR53B_RDQ40|RDQ58 (io), T32 PR35A||PR53A_RDQ40|RDQ58 (io), T33 PR38B*,RUM0_GDLLT_FB_B||PR56B*,RUM0_GDLLT_FB_B_RDQ40|RDQ58 (io), T34 PR38A*,RUM0_GDLLT_FB_A||PR56A*,RUM0_GDLLT_FB_A_RDQ40|RDQ58 (io), U23 VCCIO2 (power), U24 VCCIO2 (power), U26 PR43A*,PCLKT2_0||PR61A*,PCLKT2_0_RDQ40|RDQ58 (io), U27 PR43B*,PCLKC2_0||PR61B*,PCLKC2_0_RDQ40|RDQ58 (io), U30 PR40B||PR58B_RDQS40_N|RDQS58_N (io), U31 PR41B||PR59B_RDQ40|RDQ58 (io), U32 PR41A||PR59A_RDQ40|RDQ58 (io), U33 PR43E_B,RUM0_GPLLT_FB_B||PR61E_B,RUM0_GPLLT_FB_B_RDQ40|RDQ58 (in), U34 PR43E_A,RUM0_GPLLT_FB_A||PR61E_A,RUM0_GPLLT_FB_A_RDQ40|RDQ58 (in), V33 PR43E_D,RUM0_GPLLT_IN_B||PR61E_D,RUM0_GPLLT_IN_B_RDQ40|RDQ58 (in), V34 PR43E_C,RUM0_GPLLT_IN_A||PR61E_C,RUM0_GPLLT_IN_A_RDQ40|RDQ58 (in)